# Altium footprint library Conectores.PcbLib: 68 footprints (part 4 of 5)
Each footprint in its own frame and in the unit in brackets; x right, y up, seen from the top. Pads: shape width x height; smd on the part's side, far side on the other; paste and mask are expansions set on the pad; w line width, h text height; cw(c..) or ccw(c..) is an arc to the next point about the centre after c.
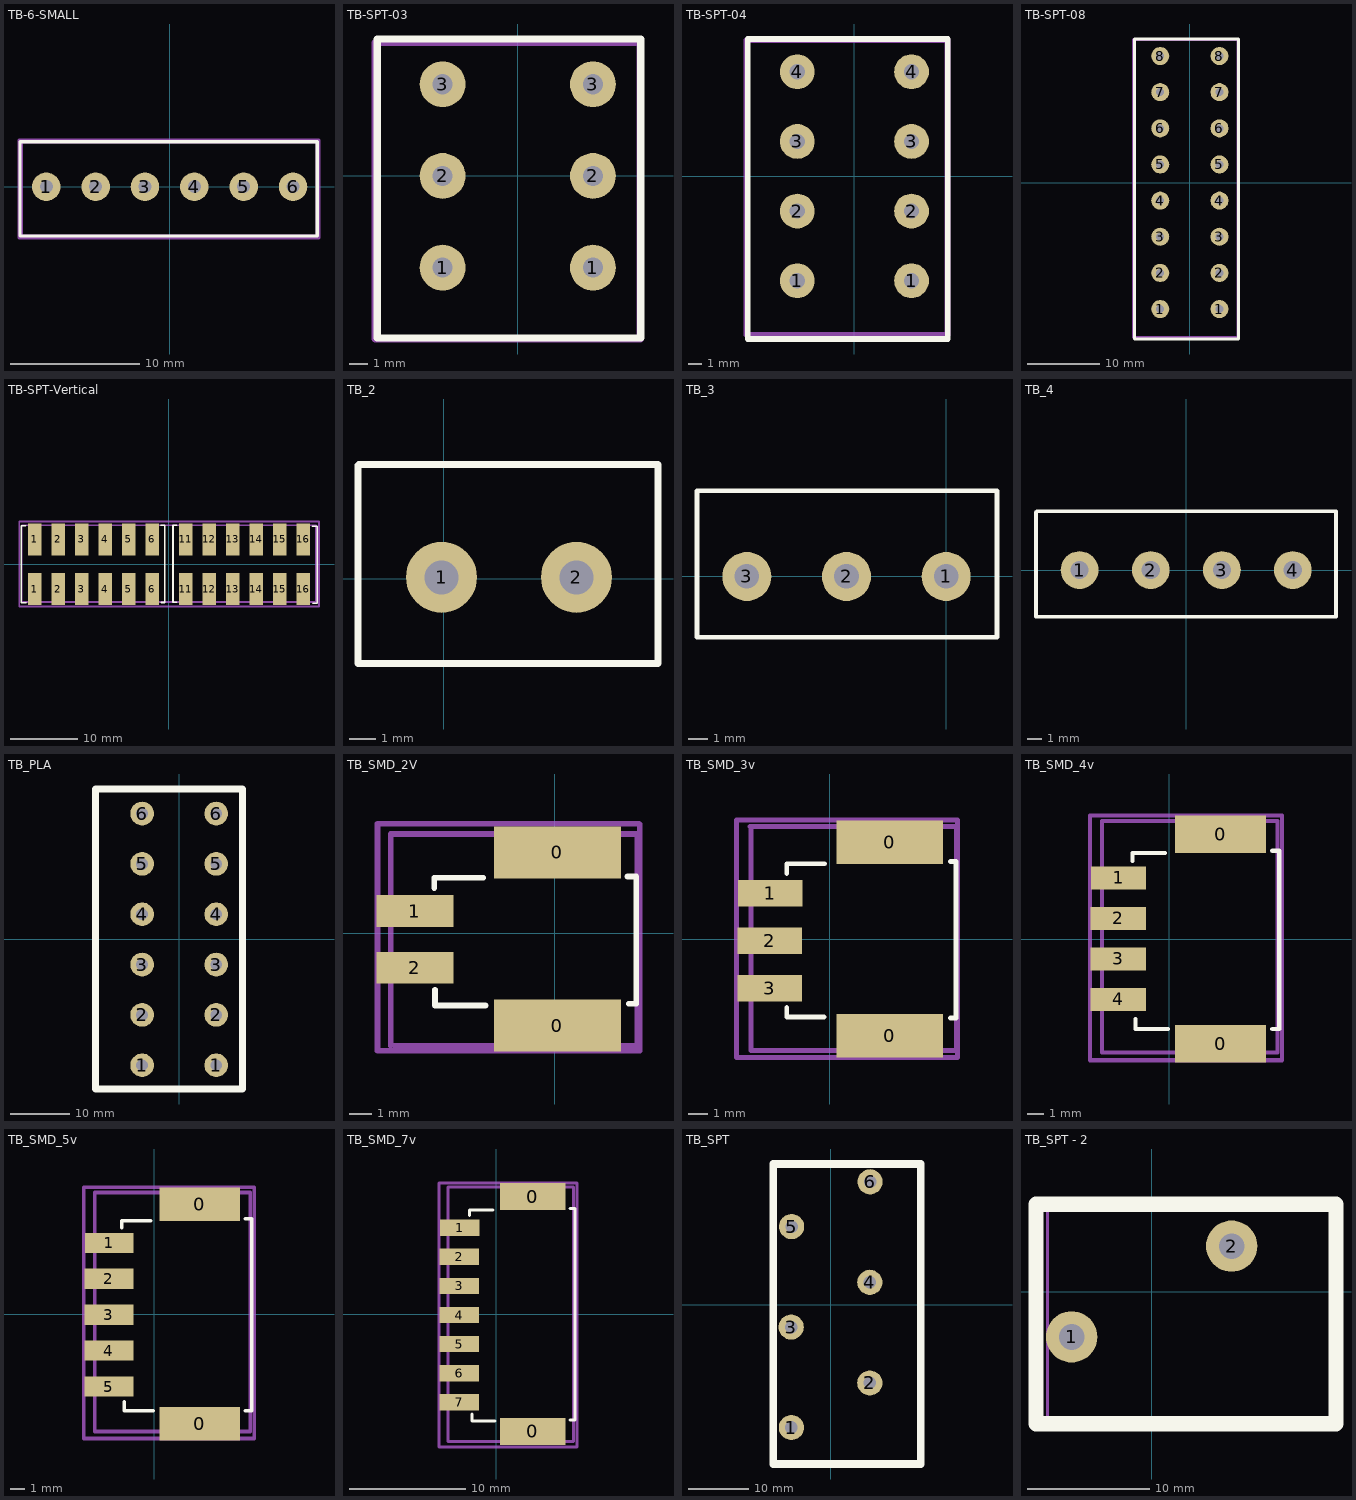
[diagram p3: the footprints below, top view; thin cyan lines are the x and y axes]

## TB-6-SMALL [mm] "6 Position Wire to Board Terminal Block Horizontal with Board 0.150\" (3.81mm) Through Hole"
pads (6):
  round 2.2 hole 1: 1(-9.525,0) 2(-5.715,0) 3(-1.905,0) 4(1.905,0) 5(5.715,0) 6(9.525,0)
Top Overlay:
  lines w0.254: -11.557,-3.81 -11.557,3.48 11.405,3.48 11.405,-3.81 -11.557,-3.81
Mechanical 13:
  lines w0.254: -11.455,-3.835 -11.455,3.465 11.405,3.465 11.405,-3.835 -11.455,-3.835
Mechanical 15:
  lines w0.254: -11.633,-3.962 11.532,-3.962 11.532,3.607 -11.633,3.607 -11.633,-3.937
3D body: height 8.55, standoff -2.55, extent -11.455,-3.835 11.405,3.465

## TB-SPT-03 [mm] "PCB terminal block, Nominal current: 41 A, Nom. voltage: 1000 V, Pitch: 7.5 mm, Number of positions: 2,  Connection method: Spring-cage conn., Mounting: Soldering, Conductor/PCB connection direction: 0 °"
pads (6):
  round 2.5 hole 1.1: 1(-4.1,-5) 1(4.1,-5) 2(-4.1,0) 2(4.1,0) 3(-4.1,5) 3(4.1,5)
Top Overlay:
  lines w0.4: -7.671,-8.839 -7.671,7.468 6.706,7.468 6.706,-8.839 -7.671,-8.839
Mechanical 13:
  lines w0.4: -7.772,7.264 -7.772,-8.89 6.68,-8.89 6.68,7.29 -7.747,7.29
3D body: height 13.95, standoff -2.05, extent -7.733,-9.059 6.667,7.341

## TB-SPT-04 [mm] "PCB terminal block, Nominal current: 41 A, Nom. voltage: 1000 V, Pitch: 7.5 mm, Number of positions: 4,  Connection method: Spring-cage conn., Mounting: Soldering, Conductor/PCB connection direction: 0 °"
pads (8):
  round 2.5 hole 1.1: 1(-4.1,-7.5) 1(4.1,-7.5) 2(-4.1,-2.5) 2(4.1,-2.5) 3(-4.1,2.5) 3(4.1,2.5) 4(-4.1,7.5) 4(4.1,7.5)
Top Overlay:
  lines w0.4: -7.671,-11.684 6.706,-11.684 6.706,9.855 -7.671,9.855 -7.671,-11.684
Mechanical 13:
  lines w0.4: -7.772,-11.39 -7.772,9.779 6.68,9.779 6.68,-11.39 -7.772,-11.39
3D body: height 13.55, standoff -2.45, extent -7.745,-11.582 6.655,9.818

## TB-SPT-08 [mm] "PCB terminal block, Nominal current: 41 A, Nom. voltage: 1000 V, Pitch: 7.5 mm, Number of positions: 4,  Connection method: Spring-cage conn., Mounting: Soldering, Conductor/PCB connection direction: 0 °"
pads (16):
  round 2.5 hole 1.1: 1(-4.1,-17.5) 1(4.1,-17.5) 2(-4.1,-12.5) 2(4.1,-12.5) 3(-4.1,-7.5) 3(4.1,-7.5) 4(-4.1,-2.5) 4(4.1,-2.5) 5(-4.1,2.5) 5(4.1,2.5) 6(-4.1,7.5) 6(4.1,7.5) 7(-4.1,12.5) 7(4.1,12.5) 8(-4.1,17.5) 8(4.1,17.5)
Top Overlay:
  lines w0.4: -7.671,-21.641 6.706,-21.641 6.706,19.855 -7.671,19.855 -7.671,-21.641
Mechanical 13:
  lines w0.4: -7.772,-21.438 -7.772,19.779 6.68,19.779 6.68,-21.438 -7.772,-21.438
3D body: height 13.55, standoff -2.45, extent -7.722,-21.614 6.678,19.786

## TB-SPT-Vertical [mm] "Wire to Board Terminal Block Vertical with Board 0.138\" (3.50mm) Surface Mount"
pads (24):
  rect 2x4.7 smd: 1(-19.975,-3.687) 1(-19.975,3.687) 2(-16.475,-3.687) 2(-16.475,3.687) 3(-12.975,-3.687) 3(-12.975,3.687) 4(-9.475,-3.687) 4(-9.475,3.687) 5(-5.975,-3.687) 5(-5.975,3.687) 6(-2.475,-3.687) 6(-2.475,3.687) 11(2.475,-3.687) 11(2.475,3.687) 12(5.975,-3.687) 12(5.975,3.687) 13(9.475,-3.687) 13(9.475,3.687) 14(12.975,-3.687) 14(12.975,3.687) 15(16.475,-3.687) 15(16.475,3.687) 16(19.975,-3.687) 16(19.975,3.687)
Top Overlay:
  lines w0.254: -21.311,5.74 -21.996,5.74 -21.996,-5.715 -21.26,-5.715 ; -1.194,5.791 -0.635,5.791 -0.635,-5.69 -1.143,-5.69 ; 1.118,5.817 0.61,5.817 0.61,-5.664 1.168,-5.664 ; 21.336,5.664 22.073,5.664 22.073,-5.791 21.387,-5.791
Mechanical 13:
  lines w0.254: -21.895,-5.613 -21.895,5.791 21.895,5.791 21.895,-5.613 -21.895,-5.613
Mechanical 15:
  lines w0.254: -22.276,-6.299 -22.276,6.375 22.327,6.375 22.327,-6.299 -22.276,-6.299
3D body: height 13.62, standoff 0, extent -21.92,-5.675 22.08,5.725

## TB_2 [mm] "Terminal Block 2 ways"
pads (2):
  round 2.7 hole 1.3: 1(-0.076,0.051) 2(5.055,0.051)
Top Overlay:
  lines w0.254: -3.251,4.318 -3.251,-3.226 8.153,-3.226 8.153,4.343 -3.226,4.343
3D body: height 10, standoff -3, extent -3.06,-2.962 7.54,4.638

## TB_3 [mm] "Terminal Block 3 Ways"
pads (3):
  round 2.5 hole 1.25: 1(0,0) 2(-5.08,0) 3(-10.16,0)
Top Overlay:
  lines w0.254: -12.7,-3.099 -12.7,4.369 2.591,4.369 2.591,-3.099 -12.7,-3.099
3D body: height 10, standoff -3.05, extent -12.7,-3.173 2.54,4.327

## TB_4 [mm]
pads (4):
  round 2.7 hole 1.3: 1(-7.607,0) 2(-2.527,0) 3(2.553,0) 4(7.607,0)
Top Overlay:
  lines w0.254: -10.719,-3.327 -10.719,4.14 -10.668,4.191 10.693,4.191 10.693,-3.327 -10.719,-3.327
3D body: height 9.95, standoff -3.4, extent -10.734,-3.318 10.706,4.182

## TB_PLA [mm] "PCB terminal block, Nominal current: 41 A, Nom. voltage: 1000 V, Pitch: 7.5 mm, Number of positions: 1,  Connection method: Spring-cage conn., Mounting: Soldering, Conductor/PCB connection direction: 0 °"
pads (12):
  round 4 hole 2: 1(-6.252,-21.234) 1(6.252,-21.234) 2(-6.252,-12.741) 2(6.252,-12.741) 3(-6.252,-4.247) 3(6.252,-4.247) 4(-6.252,4.247) 4(6.252,4.247) 5(-6.252,12.741) 5(6.252,12.741) 6(-6.252,21.234) 6(6.252,21.234)
Top Overlay:
  lines w1.254: -14.122,-25.248 10.693,-25.248 10.693,25.375 -14.122,25.375 -14.122,-25.248
3D body: height 29.08, standoff -3.05, extent -14.4,-25.498 12.055,25.502

## TB_SMD_2V [mm] "PC terminal block, 6 A, 160 V, Pitch: 2.5  mm, Spring-cage conn.,  SMD"
pads (4):
  rect 5.6x2.3 smd: 0(0.127,-4.068) 0(0.127,3.581)
  rect 3.4x1.4 smd: 1(-6.172,0.991) 2(-6.172,-1.509)
Top Overlay:
  lines w0.254: -5.309,2.007 -5.309,2.464 -3.15,2.464 ; -5.283,-2.489 -5.283,-3.175 -3.048,-3.175 ; 3.226,2.515 3.607,2.515 3.607,-3.099 3.277,-3.099
Mechanical 13:
  lines w0.254: -7.239,-4.953 -7.239,-4.775 -7.239,4.394 3.658,4.394 3.658,-4.953 -7.061,-4.953
Mechanical 15:
  lines w0.254: 3.734,4.851 -7.823,4.851 -7.823,-5.182 3.759,-5.182 3.759,4.826
3D body: height 5, standoff 0, extent -7.232,-5.016 3.768,4.384

## TB_SMD_3v [mm] "PC terminal block, 6 A, 32 V, Pitch: 2.5  mm, Spring-cage conn.,  SMD"
pads (5):
  rect 5.6x2.3 smd: 0(3.155,-5.1) 0(3.155,5.1)
  rect 3.4x1.4 smd: 1(-3.13,2.413) 2(-3.155,-0.087) 3(-3.155,-2.587)
Top Overlay:
  lines w0.254: -2.266,-3.606 -2.266,-4.114 -0.285,-4.114 ; -2.266,3.455 -2.266,3.963 -0.26,3.963 ; 6.344,-4.165 6.649,-4.165 6.649,4.09 6.344,4.09
Mechanical 13:
  lines w0.254: -4.197,5.919 6.674,5.919 6.674,-5.867 -4.146,-5.867 -4.146,5.868
Mechanical 15:
  lines w0.254: -4.908,-6.248 -4.908,6.274 6.725,6.274 6.725,-6.248 -4.908,-6.248
3D body: height 5, standoff 0, extent -4.199,-6 6.801,5.9

## TB_SMD_4v [mm] "PC terminal block, 6 A, 32 V, Pitch: 2.5  mm, Spring-cage conn.,  SMD"
pads (6):
  rect 5.6x2.3 smd: 0(3.155,-6.455) 0(3.155,6.455)
  rect 3.4x1.4 smd: 1(-3.13,3.769) 2(-3.155,1.269) 3(-3.155,-1.231) 4(-3.155,-3.731)
Top Overlay:
  lines w0.254: -2.266,4.81 -2.266,5.318 -0.26,5.318 ; -2.083,-4.94 -2.083,-5.55 -0.076,-5.55 ; 6.344,-5.55 6.782,-5.55 ; 6.344,5.445 6.782,5.445 6.782,-5.499
Mechanical 13:
  lines w0.254: -4.146,-6.998 6.674,-6.998 6.674,7.274 -4.146,7.274 -4.146,-6.972
Mechanical 15:
  lines w0.254: 6.96,-7.48 -4.908,-7.48 -4.908,7.629 6.96,7.629 6.96,-7.455
3D body: height 5, standoff 0, extent -4.216,-7.225 6.784,7.175

## TB_SMD_5v [mm] "PC terminal block, 6 A, 32 V, Pitch: 2.5  mm, Spring-cage conn.,  SMD"
pads (7):
  rect 5.6x2.3 smd: 0(3.155,-7.636) 0(3.155,7.636)
  rect 3.4x1.4 smd: 1(-3.13,4.95) 2(-3.155,2.45) 3(-3.155,-0.05) 4(-3.155,-2.55) 5(-3.155,-5.05)
Top Overlay:
  lines w0.254: -2.266,5.991 -2.266,6.499 -0.26,6.499 ; -2.083,-6.121 -2.083,-6.731 -0.076,-6.731 ; 6.344,-6.731 6.782,-6.731 6.782,6.626 6.344,6.626
Mechanical 13:
  lines w0.254: -4.146,-8.179 -4.146,8.455 6.674,8.455 6.674,-8.179 -4.146,-8.179
Mechanical 15:
  lines w0.254: -4.908,-8.661 6.96,-8.661 6.96,8.81 -4.908,8.81 -4.908,-8.661
3D body: height 5, standoff 0, extent -4.166,-8.475 6.834,8.425

## TB_SMD_7v [mm] "PC terminal block, 6 A, 32 V, Pitch: 2.5  mm, Spring-cage conn.,  SMD"
pads (9):
  rect 5.6x2.3 smd: 0(3.155,-10.1) 0(3.155,10.1)
  rect 3.4x1.4 smd: 1(-3.13,7.413) 2(-3.155,4.913) 3(-3.155,2.413) 4(-3.155,-0.087) 5(-3.155,-2.587) 6(-3.155,-5.087) 7(-3.155,-7.587)
Top Overlay:
  lines w0.254: -2.266,8.455 -2.266,8.963 -0.26,8.963 ; -2.083,-8.585 -2.083,-9.195 -0.076,-9.195 ; 6.344,-9.119 6.782,-9.119 6.782,9.09 6.344,9.09
Mechanical 13:
  lines w0.254: -4.146,-10.973 6.674,-10.973 6.674,10.919 -4.146,10.919 -4.146,-10.973
Mechanical 15:
  lines w0.254: -4.908,-11.455 -4.908,11.274 6.96,11.274 6.96,-11.455 -4.908,-11.455
3D body: height 5, standoff 0, extent -4.117,-11.055 6.883,10.845

## TB_SPT [mm] "PCB terminal block, Nominal current: 41 A, Nom. voltage: 1000 V, Pitch: 7.5 mm, Number of positions: 2,  Connection method: Spring-cage conn., Mounting: Soldering, Conductor/PCB connection direction: 0 °"
pads (6):
  round 4.2 hole 2.1: 1(-6.566,-20.523) 2(6.54,-13.081) 3(-6.591,-3.759) 4(6.54,3.734) 5(-6.515,13.03) 6(6.591,20.523)
Top Overlay:
  lines w1.254: -9.627,-26.619 15.088,-26.619 15.088,23.495 -9.627,23.495 -9.627,-26.619
3D body: height 20.35, standoff -3.85, extent -8.522,-27.083 15.628,23.317

## TB_SPT - 2 [mm] "PCB terminal block, Nominal current: 41 A, Nom. voltage: 1000 V, Pitch: 7.5 mm, Number of positions: 2,  Connection method: Spring-cage conn., Mounting: Soldering, Conductor/PCB connection direction: 0 °"
pads (2):
  round 4.2 hole 2.1: 1(-6.553,-3.721) 2(6.553,3.721)
Top Overlay:
  lines w1.254: -9.474,-10.82 -9.474,7.137 15.1,7.137 15.1,-10.82 -9.474,-10.82
Mechanical 13:
  lines w0.254: -8.992,7.061 14.808,7.061 14.808,-10.439 -8.534,-10.439 -8.534,6.604
3D body: height 20.45, standoff -3.75, extent -8.544,-10.312 15.606,6.488